# Altium footprint library texas.PCBLIB: 124 footprints (part 7 of 12)
Each footprint in its own frame and in the unit in brackets; x right, y up, seen from the top. Pads: shape width x height; smd on the part's side, far side on the other; paste and mask are expansions set on the pad; w line width, h text height; cw(c..) or ccw(c..) is an arc to the next point about the centre after c.
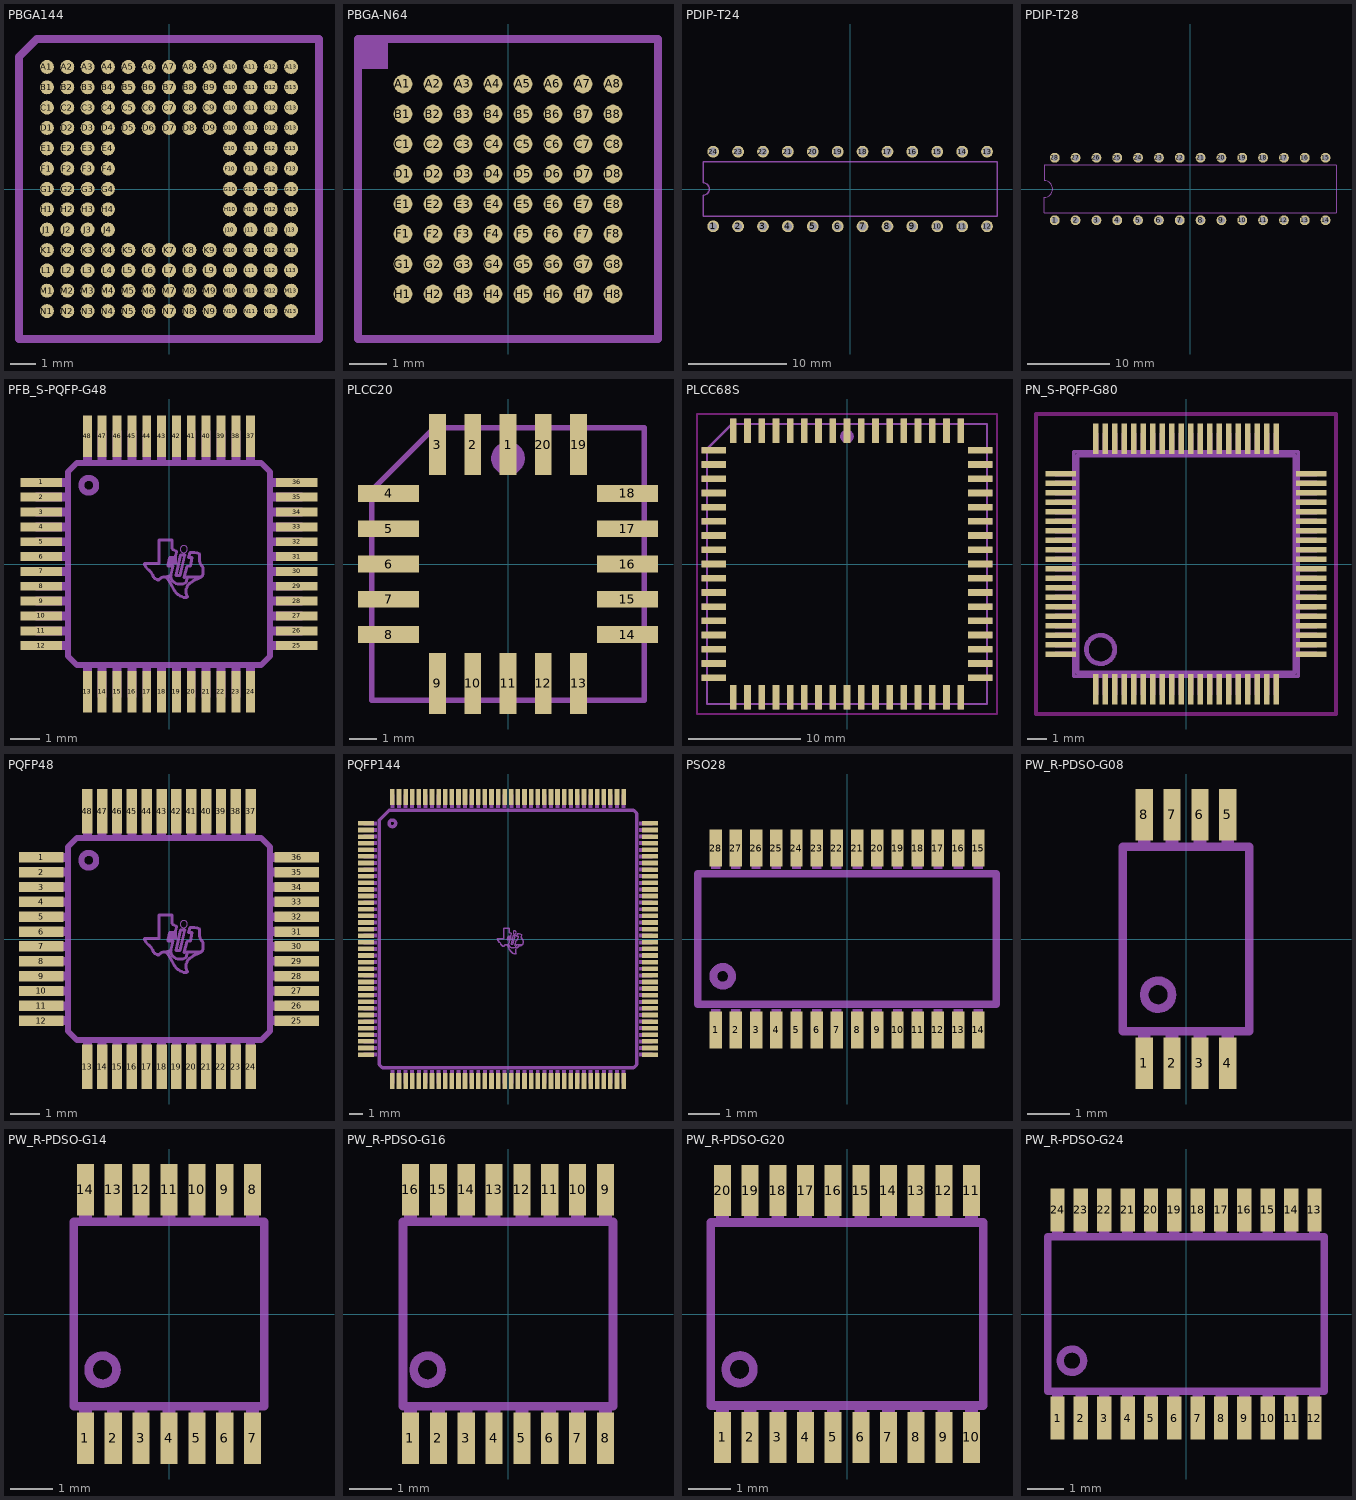
[diagram p6: the footprints below, top view; thin cyan lines are the x and y axes]

## PBGA144 [mm]
pads (144):
  rrect100% 0.55x0.55 smd: A1(-4.8,4.8) A2(-4,4.8) A3(-3.2,4.8) A4(-2.4,4.8) A5(-1.6,4.8) A6(-0.8,4.8) A7(0,4.8) A8(0.8,4.8) A9(1.6,4.8) A10(2.4,4.8) A11(3.2,4.8) A12(4,4.8) A13(4.8,4.8) B1(-4.8,4) B2(-4,4) B3(-3.2,4) B4(-2.4,4) B5(-1.6,4) B6(-0.8,4) B7(0,4) B8(0.8,4) B9(1.6,4) B10(2.4,4) B11(3.2,4) B12(4,4) B13(4.8,4) C1(-4.8,3.2) C2(-4,3.2) C3(-3.2,3.2) C4(-2.4,3.2) C5(-1.6,3.2) C6(-0.8,3.2) C7(0,3.2) C8(0.8,3.2) C9(1.6,3.2) C10(2.4,3.2) C11(3.2,3.2) C12(4,3.2) C13(4.8,3.2) D1(-4.8,2.4) D2(-4,2.4) D3(-3.2,2.4) D4(-2.4,2.4) D5(-1.6,2.4) D6(-0.8,2.4) D7(0,2.4) D8(0.8,2.4) D9(1.6,2.4) D10(2.4,2.4) D11(3.2,2.4) D12(4,2.4) D13(4.8,2.4) E1(-4.8,1.6) E2(-4,1.6) E3(-3.2,1.6) E4(-2.4,1.6) E10(2.4,1.6) E11(3.2,1.6) E12(4,1.6) E13(4.8,1.6) F1(-4.8,0.8) F2(-4,0.8) F3(-3.2,0.8) F4(-2.4,0.8) F10(2.4,0.8) F11(3.2,0.8) F12(4,0.8) F13(4.8,0.8) G1(-4.8,0) G2(-4,0) G3(-3.2,0) G4(-2.4,0) G10(2.4,0) G11(3.2,0) G12(4,0) G13(4.8,0) H1(-4.8,-0.8) H2(-4,-0.8) H3(-3.2,-0.8) H4(-2.4,-0.8) H10(2.4,-0.8) H11(3.2,-0.8) H12(4,-0.8) H13(4.8,-0.8) J1(-4.8,-1.6) J2(-4,-1.6) J3(-3.2,-1.6) J4(-2.4,-1.6) J10(2.4,-1.6) J11(3.2,-1.6) J12(4,-1.6) J13(4.8,-1.6) K1(-4.8,-2.4) K2(-4,-2.4) K3(-3.2,-2.4) K4(-2.4,-2.4) K5(-1.6,-2.4) K6(-0.8,-2.4) K7(0,-2.4) K8(0.8,-2.4) K9(1.6,-2.4) K10(2.4,-2.4) K11(3.2,-2.4) K12(4,-2.4) K13(4.8,-2.4) L1(-4.8,-3.2) L2(-4,-3.2) L3(-3.2,-3.2) L4(-2.4,-3.2) L5(-1.6,-3.2) L6(-0.8,-3.2) L7(0,-3.2) L8(0.8,-3.2) L9(1.6,-3.2) L10(2.4,-3.2) L11(3.2,-3.2) L12(4,-3.2) L13(4.8,-3.2) M1(-4.8,-4) M2(-4,-4) M3(-3.2,-4) M4(-2.4,-4) M5(-1.6,-4) M6(-0.8,-4) M7(0,-4) M8(0.8,-4) M9(1.6,-4) M10(2.4,-4) M11(3.2,-4) M12(4,-4) M13(4.8,-4) N1(-4.8,-4.8) N2(-4,-4.8) N3(-3.2,-4.8) N4(-2.4,-4.8) N5(-1.6,-4.8) N6(-0.8,-4.8) N7(0,-4.8) N8(0.8,-4.8) N9(1.6,-4.8) N10(2.4,-4.8) N11(3.2,-4.8) N12(4,-4.8) N13(4.8,-4.8)
Mechanical 2:
  lines w0.303: -5.9,-5.9 5.9,-5.9 5.9,5.9 -5.2,5.9 -5.9,5.2 -5.9,-5.9

## PBGA-N64 [mm]
pads (64):
  rrect100% 0.5x0.5 smd mask-0.25: A1(-2.8,2.8) A2(-2,2.8) A3(-1.2,2.8) A4(-0.4,2.8) A5(0.4,2.8) A6(1.2,2.8) A7(2,2.8) A8(2.8,2.8) B1(-2.8,2) B2(-2,2) B3(-1.2,2) B4(-0.4,2) B5(0.4,2) B6(1.2,2) B7(2,2) B8(2.8,2) C1(-2.8,1.2) C2(-2,1.2) C3(-1.2,1.2) C4(-0.4,1.2) C5(0.4,1.2) C6(1.2,1.2) C7(2,1.2) C8(2.8,1.2) D1(-2.8,0.4) D2(-2,0.4) D3(-1.2,0.4) D4(-0.4,0.4) D5(0.4,0.4) D6(1.2,0.4) D7(2,0.4) D8(2.8,0.4) E1(-2.8,-0.4) E2(-2,-0.4) E3(-1.2,-0.4) E4(-0.4,-0.4) E5(0.4,-0.4) E6(1.2,-0.4) E7(2,-0.4) E8(2.8,-0.4) F1(-2.8,-1.2) F2(-2,-1.2) F3(-1.2,-1.2) F4(-0.4,-1.2) F5(0.4,-1.2) F6(1.2,-1.2) F7(2,-1.2) F8(2.8,-1.2) G1(-2.8,-2) G2(-2,-2) G3(-1.2,-2) G4(-0.4,-2) G5(0.4,-2) G6(1.2,-2) G7(2,-2) G8(2.8,-2) H1(-2.8,-2.8) H2(-2,-2.8) H3(-1.2,-2.8) H4(-0.4,-2.8) H5(0.4,-2.8) H6(1.2,-2.8) H7(2,-2.8) H8(2.8,-2.8)
Top Solder:
  circle w0: c-2.8,2.8 r0.25
  circle w0: c-2.8,2 r0.25
  circle w0: c-2.8,1.2 r0.25
  circle w0: c-2.8,0.4 r0.25
  circle w0: c-2.8,-0.4 r0.25
  circle w0: c-2.8,-1.2 r0.25
  circle w0: c-2.8,-2 r0.25
  circle w0: c-2.8,-2.8 r0.25
  circle w0: c-2,2.8 r0.25
  circle w0: c-2,2 r0.25
  circle w0: c-2,1.2 r0.25
  circle w0: c-2,0.4 r0.25
  circle w0: c-2,-0.4 r0.25
  circle w0: c-2,-1.2 r0.25
  circle w0: c-2,-2 r0.25
  circle w0: c-2,-2.8 r0.25
  circle w0: c-1.2,2.8 r0.25
  circle w0: c-1.2,2 r0.25
  circle w0: c-1.2,1.2 r0.25
  circle w0: c-1.2,0.4 r0.25
  circle w0: c-1.2,-0.4 r0.25
  circle w0: c-1.2,-1.2 r0.25
  circle w0: c-1.2,-2 r0.25
  circle w0: c-1.2,-2.8 r0.25
  circle w0: c-0.4,2.8 r0.25
  circle w0: c-0.4,2 r0.25
  circle w0: c-0.4,1.2 r0.25
  circle w0: c-0.4,0.4 r0.25
  circle w0: c-0.4,-0.4 r0.25
  circle w0: c-0.4,-1.2 r0.25
  circle w0: c-0.4,-2 r0.25
  circle w0: c-0.4,-2.8 r0.25
  circle w0: c0.4,2.8 r0.25
  circle w0: c0.4,2 r0.25
  circle w0: c0.4,1.2 r0.25
  circle w0: c0.4,0.4 r0.25
  circle w0: c0.4,-0.4 r0.25
  circle w0: c0.4,-1.2 r0.25
  circle w0: c0.4,-2 r0.25
  circle w0: c0.4,-2.8 r0.25
  circle w0: c1.2,2.8 r0.25
  circle w0: c1.2,2 r0.25
  circle w0: c1.2,1.2 r0.25
  circle w0: c1.2,0.4 r0.25
  circle w0: c1.2,-0.4 r0.25
  circle w0: c1.2,-1.2 r0.25
  circle w0: c1.2,-2 r0.25
  circle w0: c1.2,-2.8 r0.25
  circle w0: c2,2.8 r0.25
  circle w0: c2,2 r0.25
  circle w0: c2,1.2 r0.25
  circle w0: c2,0.4 r0.25
  circle w0: c2,-0.4 r0.25
  circle w0: c2,-1.2 r0.25
  circle w0: c2,-2 r0.25
  circle w0: c2,-2.8 r0.25
  circle w0: c2.8,2.8 r0.25
  circle w0: c2.8,2 r0.25
  circle w0: c2.8,1.2 r0.25
  circle w0: c2.8,0.4 r0.25
  circle w0: c2.8,-0.4 r0.25
  circle w0: c2.8,-1.2 r0.25
  circle w0: c2.8,-2 r0.25
  circle w0: c2.8,-2.8 r0.25
Mechanical 2:
  rectangle: -4,3.2 -3.2,4
  lines w0.203: -4,-4 4,-4 4,4 -4,4 -4,-4

## PDIP-T24 [mil]
pads (24):
  round 47.24 hole 32: 1(-550,-150) 2(-450,-150) 3(-350,-150) 4(-250,-150) 5(-150,-150) 6(-50,-150) 7(50,-150) 8(150,-150) 9(250,-150) 10(350,-150) 11(450,-150) 12(550,-150) 13(550,150) 14(450,150) 15(350,150) 16(250,150) 17(150,150) 18(50,150) 19(-50,150) 20(-150,150) 21(-250,150) 22(-350,150) 23(-450,150) 24(-550,150)
Mechanical 2:
  lines w6: -590,-110 -590,-25 ccw(c-590,0) -590,25 -590,110 590,110 590,-110 -590,-110

## PDIP-T28 [mil]
pads (28):
  round 47.24 hole 32: 1(-650,-150) 2(-550,-150) 3(-450,-150) 4(-350,-150) 5(-250,-150) 6(-150,-150) 7(-50,-150) 8(50,-150) 9(150,-150) 10(250,-150) 11(350,-150) 12(450,-150) 13(550,-150) 14(650,-150) 15(650,150) 16(550,150) 17(450,150) 18(350,150) 19(250,150) 20(150,150) 21(50,150) 22(-50,150) 23(-150,150) 24(-250,150) 25(-350,150) 26(-450,150) 27(-550,150) 28(-650,150)
Mechanical 2:
  lines w6: -700,-115 700,-115 700,115 -700,115 -700,40 cw(c-700,0) -700,-40 -700,-115

## PFB_S-PQFP-G48 [mm]
pads (48):
  rect 1.4x0.3 smd mask-0.7: 1(-4.3,2.75) 2(-4.3,2.25) 3(-4.3,1.75) 4(-4.3,1.25) 5(-4.3,0.75) 6(-4.3,0.25) 7(-4.3,-0.25) 8(-4.3,-0.75) 9(-4.3,-1.25) 10(-4.3,-1.75) 11(-4.3,-2.25) 12(-4.3,-2.75) 25(4.3,-2.75) 26(4.3,-2.25) 27(4.3,-1.75) 28(4.3,-1.25) 29(4.3,-0.75) 30(4.3,-0.25) 31(4.3,0.25) 32(4.3,0.75) 33(4.3,1.25) 34(4.3,1.75) 35(4.3,2.25) 36(4.3,2.75)
  rect 0.3x1.4 smd mask-0.7: 13(-2.75,-4.3) 14(-2.25,-4.3) 15(-1.75,-4.3) 16(-1.25,-4.3) 17(-0.75,-4.3) 18(-0.25,-4.3) 19(0.25,-4.3) 20(0.75,-4.3) 21(1.25,-4.3) 22(1.75,-4.3) 23(2.25,-4.3) 24(2.75,-4.3) 37(2.75,4.3) 38(2.25,4.3) 39(1.75,4.3) 40(1.25,4.3) 41(0.75,4.3) 42(0.25,4.3) 43(-0.25,4.3) 44(-0.75,4.3) 45(-1.25,4.3) 46(-1.75,4.3) 47(-2.25,4.3) 48(-2.75,4.3)
Top Solder:
  rectangle: -5.05,2.575 -3.55,2.925
  rectangle: -5.05,2.075 -3.55,2.425
  rectangle: -5.05,1.575 -3.55,1.925
  rectangle: -5.05,1.075 -3.55,1.425
  rectangle: -5.05,0.575 -3.55,0.925
  rectangle: -5.05,0.075 -3.55,0.425
  rectangle: -5.05,-0.425 -3.55,-0.075
  rectangle: -5.05,-0.925 -3.55,-0.575
  rectangle: -5.05,-1.425 -3.55,-1.075
  rectangle: -5.05,-1.925 -3.55,-1.575
  rectangle: -5.05,-2.425 -3.55,-2.075
  rectangle: -5.05,-2.925 -3.55,-2.575
  region: -2.575,-5.05 -2.575,-3.55 -2.925,-3.55 -2.925,-5.05
  region: -2.075,-5.05 -2.075,-3.55 -2.425,-3.55 -2.425,-5.05
  region: -1.575,-5.05 -1.575,-3.55 -1.925,-3.55 -1.925,-5.05
  region: -1.075,-5.05 -1.075,-3.55 -1.425,-3.55 -1.425,-5.05
  region: -0.575,-5.05 -0.575,-3.55 -0.925,-3.55 -0.925,-5.05
  region: -0.075,-5.05 -0.075,-3.55 -0.425,-3.55 -0.425,-5.05
  region: 0.425,-5.05 0.425,-3.55 0.075,-3.55 0.075,-5.05
  region: 0.925,-5.05 0.925,-3.55 0.575,-3.55 0.575,-5.05
  region: 1.425,-5.05 1.425,-3.55 1.075,-3.55 1.075,-5.05
  region: 1.925,-5.05 1.925,-3.55 1.575,-3.55 1.575,-5.05
  region: 2.425,-5.05 2.425,-3.55 2.075,-3.55 2.075,-5.05
  region: 2.925,-5.05 2.925,-3.55 2.575,-3.55 2.575,-5.05
  region: 5.05,-2.575 3.55,-2.575 3.55,-2.925 5.05,-2.925
  region: 5.05,-2.075 3.55,-2.075 3.55,-2.425 5.05,-2.425
  region: 5.05,-1.575 3.55,-1.575 3.55,-1.925 5.05,-1.925
  region: 5.05,-1.075 3.55,-1.075 3.55,-1.425 5.05,-1.425
  region: 5.05,-0.575 3.55,-0.575 3.55,-0.925 5.05,-0.925
  region: 5.05,-0.075 3.55,-0.075 3.55,-0.425 5.05,-0.425
  region: 5.05,0.425 3.55,0.425 3.55,0.075 5.05,0.075
  region: 5.05,0.925 3.55,0.925 3.55,0.575 5.05,0.575
  region: 5.05,1.425 3.55,1.425 3.55,1.075 5.05,1.075
  region: 5.05,1.925 3.55,1.925 3.55,1.575 5.05,1.575
  region: 5.05,2.425 3.55,2.425 3.55,2.075 5.05,2.075
  region: 5.05,2.925 3.55,2.925 3.55,2.575 5.05,2.575
  region: 2.575,5.05 2.575,3.55 2.925,3.55 2.925,5.05
  region: 2.075,5.05 2.075,3.55 2.425,3.55 2.425,5.05
  region: 1.575,5.05 1.575,3.55 1.925,3.55 1.925,5.05
  region: 1.075,5.05 1.075,3.55 1.425,3.55 1.425,5.05
  region: 0.575,5.05 0.575,3.55 0.925,3.55 0.925,5.05
  region: 0.075,5.05 0.075,3.55 0.425,3.55 0.425,5.05
  region: -0.425,5.05 -0.425,3.55 -0.075,3.55 -0.075,5.05
  region: -0.925,5.05 -0.925,3.55 -0.575,3.55 -0.575,5.05
  region: -1.425,5.05 -1.425,3.55 -1.075,3.55 -1.075,5.05
  region: -1.925,5.05 -1.925,3.55 -1.575,3.55 -1.575,5.05
  region: -2.425,5.05 -2.425,3.55 -2.075,3.55 -2.075,5.05
  region: -2.925,5.05 -2.925,3.55 -2.575,3.55 -2.575,5.05
Mechanical 2:
  circle w0.203: c-2.7,2.65 r0.25
  lines w0.203: -3.4,-3.1 -3.4,3.1 -3.1,3.4 3.1,3.4 3.4,3.1 3.4,-3.1 3.1,-3.4 -3.1,-3.4 -3.4,-3.1
Mechanical 18:
  drawing of 146 lines, arcs and shapes, not listed

## PLCC20 [mm]
pads (20):
  rect 0.6x2.2 smd: 1(0,4.3) 2(-1.27,4.3) 3(-2.54,4.3) 9(-2.54,-4.3) 10(-1.27,-4.3) 11(0,-4.3) 12(1.27,-4.3) 13(2.54,-4.3) 19(2.54,4.3) 20(1.27,4.3)
  rect 2.2x0.6 smd: 4(-4.3,2.54) 5(-4.3,1.27) 6(-4.3,0) 7(-4.3,-1.27) 8(-4.3,-2.54) 14(4.3,-2.54) 15(4.3,-1.27) 16(4.3,0) 17(4.3,1.27) 18(4.3,2.54)
Mechanical 18:
  circle w0.61: c0,3.8 r0.3
  rectangle: -0.26,4.95 0.26,5.4
  rectangle: -1.53,4.95 -1.01,5.4
  rectangle: -2.8,4.95 -2.28,5.4
  rectangle: -5.4,2.28 -4.95,2.8
  rectangle: -5.4,1.01 -4.95,1.53
  rectangle: -5.4,-0.26 -4.95,0.26
  rectangle: -5.4,-1.53 -4.95,-1.01
  rectangle: -5.4,-2.8 -4.95,-2.28
  rectangle: -2.8,-5.4 -2.28,-4.95
  rectangle: -1.53,-5.4 -1.01,-4.95
  rectangle: -0.26,-5.4 0.26,-4.95
  rectangle: 1.01,-5.4 1.53,-4.95
  rectangle: 2.28,-5.4 2.8,-4.95
  rectangle: 4.95,-2.8 5.4,-2.28
  rectangle: 4.95,-1.53 5.4,-1.01
  rectangle: 4.95,-0.26 5.4,0.26
  rectangle: 4.95,1.01 5.4,1.53
  rectangle: 4.95,2.28 5.4,2.8
  rectangle: 2.28,4.95 2.8,5.4
  rectangle: 1.01,4.95 1.53,5.4
  lines w0.203: -4.9,-4.9 -4.9,2.665 -2.665,4.9 4.9,4.9 4.9,-4.9 -4.9,-4.9

## PLCC68S [mil]
pads (68):
  rect 23.62x86.61 smd: 1(0,468.5) 2(-50,468.5) 3(-100,468.5) 4(-150,468.5) 5(-200,468.5) 6(-250,468.5) 7(-300,468.5) 8(-350,468.5) 9(-400,468.5) 27(-400,-468.5) 28(-350,-468.5) 29(-300,-468.5) 30(-250,-468.5) 31(-200,-468.5) 32(-150,-468.5) 33(-100,-468.5) 34(-50,-468.5) 35(0,-468.5) 36(50,-468.5) 37(100,-468.5) 38(150,-468.5) 39(200,-468.5) 40(250,-468.5) 41(300,-468.5) 42(350,-468.5) 43(400,-468.5) 61(400,468.5) 62(350,468.5) 63(300,468.5) 64(250,468.5) 65(200,468.5) 66(150,468.5) 67(100,468.5) 68(50,468.5)
  rect 86.61x23.62 smd: 10(-468.5,400) 11(-468.5,350) 12(-468.5,300) 13(-468.5,250) 14(-468.5,200) 15(-468.5,150) 16(-468.5,100) 17(-468.5,50) 18(-468.5,0) 19(-468.5,-50) 20(-468.5,-100) 21(-468.5,-150) 22(-468.5,-200) 23(-468.5,-250) 24(-468.5,-300) 25(-468.5,-350) 26(-468.5,-400) 44(468.5,-400) 45(468.5,-350) 46(468.5,-300) 47(468.5,-250) 48(468.5,-200) 49(468.5,-150) 50(468.5,-100) 51(468.5,-50) 52(468.5,0) 53(468.5,50) 54(468.5,100) 55(468.5,150) 56(468.5,200) 57(468.5,250) 58(468.5,300) 59(468.5,350) 60(468.5,400)
Keep-Out Layer:
  lines w7.87: -527.68,-527.68 527.68,-527.68 527.68,527.68 -527.68,527.68 -527.68,-527.68
Mechanical 18:
  circle w24: c0,448.82 r11.81
  rectangle: -10.24,494.09 10.24,511.81
  rectangle: -60.24,494.09 -39.76,511.81
  rectangle: -110.24,494.09 -89.76,511.81
  rectangle: -160.24,494.09 -139.76,511.81
  rectangle: -210.24,494.09 -189.76,511.81
  rectangle: -260.24,494.09 -239.76,511.81
  rectangle: -310.24,494.09 -289.76,511.81
  rectangle: -360.24,494.09 -339.76,511.81
  rectangle: -410.24,494.09 -389.76,511.81
  rectangle: -511.81,389.76 -494.09,410.24
  rectangle: -511.81,339.76 -494.09,360.24
  rectangle: -511.81,289.76 -494.09,310.24
  rectangle: -511.81,239.76 -494.09,260.24
  rectangle: -511.81,189.76 -494.09,210.24
  rectangle: -511.81,139.76 -494.09,160.24
  rectangle: -511.81,89.76 -494.09,110.24
  rectangle: -511.81,39.76 -494.09,60.24
  rectangle: -511.81,-10.24 -494.09,10.24
  rectangle: -511.81,-60.24 -494.09,-39.76
  rectangle: -511.81,-110.24 -494.09,-89.76
  rectangle: -511.81,-160.24 -494.09,-139.76
  rectangle: -511.81,-210.24 -494.09,-189.76
  rectangle: -511.81,-260.24 -494.09,-239.76
  rectangle: -511.81,-310.24 -494.09,-289.76
  rectangle: -511.81,-360.24 -494.09,-339.76
  rectangle: -511.81,-410.24 -494.09,-389.76
  rectangle: -410.24,-511.81 -389.76,-494.09
  rectangle: -360.24,-511.81 -339.76,-494.09
  rectangle: -310.24,-511.81 -289.76,-494.09
  rectangle: -260.24,-511.81 -239.76,-494.09
  rectangle: -210.24,-511.81 -189.76,-494.09
  rectangle: -160.24,-511.81 -139.76,-494.09
  rectangle: -110.24,-511.81 -89.76,-494.09
  rectangle: -60.24,-511.81 -39.76,-494.09
  rectangle: -10.24,-511.81 10.24,-494.09
  rectangle: 39.76,-511.81 60.24,-494.09
  rectangle: 89.76,-511.81 110.24,-494.09
  rectangle: 139.76,-511.81 160.24,-494.09
  rectangle: 189.76,-511.81 210.24,-494.09
  rectangle: 239.76,-511.81 260.24,-494.09
  rectangle: 289.76,-511.81 310.24,-494.09
  rectangle: 339.76,-511.81 360.24,-494.09
  rectangle: 389.76,-511.81 410.24,-494.09
  rectangle: 494.09,-410.24 511.81,-389.76
  rectangle: 494.09,-360.24 511.81,-339.76
  rectangle: 494.09,-310.24 511.81,-289.76
  rectangle: 494.09,-260.24 511.81,-239.76
  rectangle: 494.09,-210.24 511.81,-189.76
  rectangle: 494.09,-160.24 511.81,-139.76
  rectangle: 494.09,-110.24 511.81,-89.76
  rectangle: 494.09,-60.24 511.81,-39.76
  rectangle: 494.09,-10.24 511.81,10.24
  rectangle: 494.09,39.76 511.81,60.24
  rectangle: 494.09,89.76 511.81,110.24
  rectangle: 494.09,139.76 511.81,160.24
  rectangle: 494.09,189.76 511.81,210.24
  rectangle: 494.09,239.76 511.81,260.24
  rectangle: 494.09,289.76 511.81,310.24
  rectangle: 494.09,339.76 511.81,360.24
  rectangle: 494.09,389.76 511.81,410.24
  rectangle: 389.76,494.09 410.24,511.81
  rectangle: 339.76,494.09 360.24,511.81
  rectangle: 289.76,494.09 310.24,511.81
  rectangle: 239.76,494.09 260.24,511.81
  rectangle: 189.76,494.09 210.24,511.81
  rectangle: 139.76,494.09 160.24,511.81
  rectangle: 89.76,494.09 110.24,511.81
  rectangle: 39.76,494.09 60.24,511.81
  lines w8: -492.13,-492.13 -492.13,404.13 -404.13,492.13 492.13,492.13 492.13,-492.13 -492.13,-492.13

## PN_S-PQFP-G80 [mm]
pads (80):
  rect 0.3x1.6 smd: 1(-4.75,-6.6) 2(-4.25,-6.6) 3(-3.75,-6.6) 4(-3.25,-6.6) 5(-2.75,-6.6) 6(-2.25,-6.6) 7(-1.75,-6.6) 8(-1.25,-6.6) 9(-0.75,-6.6) 10(-0.25,-6.6) 11(0.25,-6.6) 12(0.75,-6.6) 13(1.25,-6.6) 14(1.75,-6.6) 15(2.25,-6.6) 16(2.75,-6.6) 17(3.25,-6.6) 18(3.75,-6.6) 19(4.25,-6.6) 20(4.75,-6.6) 41(4.75,6.6) 42(4.25,6.6) 43(3.75,6.6) 44(3.25,6.6) 45(2.75,6.6) 46(2.25,6.6) 47(1.75,6.6) 48(1.25,6.6) 49(0.75,6.6) 50(0.25,6.6) 51(-0.25,6.6) 52(-0.75,6.6) 53(-1.25,6.6) 54(-1.75,6.6) 55(-2.25,6.6) 56(-2.75,6.6) 57(-3.25,6.6) 58(-3.75,6.6) 59(-4.25,6.6) 60(-4.75,6.6)
  rect 1.6x0.3 smd: 21(6.6,-4.75) 22(6.6,-4.25) 23(6.6,-3.75) 24(6.6,-3.25) 25(6.6,-2.75) 26(6.6,-2.25) 27(6.6,-1.75) 28(6.6,-1.25) 29(6.6,-0.75) 30(6.6,-0.25) 31(6.6,0.25) 32(6.6,0.75) 33(6.6,1.25) 34(6.6,1.75) 35(6.6,2.25) 36(6.6,2.75) 37(6.6,3.25) 38(6.6,3.75) 39(6.6,4.25) 40(6.6,4.75) 61(-6.6,4.75) 62(-6.6,4.25) 63(-6.6,3.75) 64(-6.6,3.25) 65(-6.6,2.75) 66(-6.6,2.25) 67(-6.6,1.75) 68(-6.6,1.25) 69(-6.6,0.75) 70(-6.6,0.25) 71(-6.6,-0.25) 72(-6.6,-0.75) 73(-6.6,-1.25) 74(-6.6,-1.75) 75(-6.6,-2.25) 76(-6.6,-2.75) 77(-6.6,-3.25) 78(-6.6,-3.75) 79(-6.6,-4.25) 80(-6.6,-4.75)
Keep-Out Layer:
  lines w0.2: -7.9,-7.9 -7.9,7.9 7.9,7.9 7.9,-7.9 -7.9,-7.9
Mechanical 2:
  circle w0.254: c-4.5,-4.5 r0.75
  lines w0.203: -5.72,-5.71 5.71,-5.71 5.71,5.71 -5.72,5.71 -5.72,-5.71
Mechanical 18:
  rectangle: -4.9,-6.9 -4.6,-5.95
  rectangle: -4.4,-6.9 -4.1,-5.95
  rectangle: -3.9,-6.9 -3.6,-5.95
  rectangle: -3.4,-6.9 -3.1,-5.95
  rectangle: -2.9,-6.9 -2.6,-5.95
  rectangle: -2.4,-6.9 -2.1,-5.95
  rectangle: -1.9,-6.9 -1.6,-5.95
  rectangle: -1.4,-6.9 -1.1,-5.95
  rectangle: -0.9,-6.9 -0.6,-5.95
  rectangle: -0.4,-6.9 -0.1,-5.95
  rectangle: 0.1,-6.9 0.4,-5.95
  rectangle: 0.6,-6.9 0.9,-5.95
  rectangle: 1.1,-6.9 1.4,-5.95
  rectangle: 1.6,-6.9 1.9,-5.95
  rectangle: 2.1,-6.9 2.4,-5.95
  rectangle: 2.6,-6.9 2.9,-5.95
  rectangle: 3.1,-6.9 3.4,-5.95
  rectangle: 3.6,-6.9 3.9,-5.95
  rectangle: 4.1,-6.9 4.4,-5.95
  rectangle: 4.6,-6.9 4.9,-5.95
  rectangle: 5.95,-4.9 6.9,-4.6
  rectangle: 5.95,-4.4 6.9,-4.1
  rectangle: 5.95,-3.9 6.9,-3.6
  rectangle: 5.95,-3.4 6.9,-3.1
  rectangle: 5.95,-2.9 6.9,-2.6
  rectangle: 5.95,-2.4 6.9,-2.1
  rectangle: 5.95,-1.9 6.9,-1.6
  rectangle: 5.95,-1.4 6.9,-1.1
  rectangle: 5.95,-0.9 6.9,-0.6
  rectangle: 5.95,-0.4 6.9,-0.1
  rectangle: 5.95,0.1 6.9,0.4
  rectangle: 5.95,0.6 6.9,0.9
  rectangle: 5.95,1.1 6.9,1.4
  rectangle: 5.95,1.6 6.9,1.9
  rectangle: 5.95,2.1 6.9,2.4
  rectangle: 5.95,2.6 6.9,2.9
  rectangle: 5.95,3.1 6.9,3.4
  rectangle: 5.95,3.6 6.9,3.9
  rectangle: 5.95,4.1 6.9,4.4
  rectangle: 5.95,4.6 6.9,4.9
  rectangle: 4.6,5.95 4.9,6.9
  rectangle: 4.1,5.95 4.4,6.9
  rectangle: 3.6,5.95 3.9,6.9
  rectangle: 3.1,5.95 3.4,6.9
  rectangle: 2.6,5.95 2.9,6.9
  rectangle: 2.1,5.95 2.4,6.9
  rectangle: 1.6,5.95 1.9,6.9
  rectangle: 1.1,5.95 1.4,6.9
  rectangle: 0.6,5.95 0.9,6.9
  rectangle: 0.1,5.95 0.4,6.9
  rectangle: -0.4,5.95 -0.1,6.9
  rectangle: -0.9,5.95 -0.6,6.9
  rectangle: -1.4,5.95 -1.1,6.9
  rectangle: -1.9,5.95 -1.6,6.9
  rectangle: -2.4,5.95 -2.1,6.9
  rectangle: -2.9,5.95 -2.6,6.9
  rectangle: -3.4,5.95 -3.1,6.9
  rectangle: -3.9,5.95 -3.6,6.9
  rectangle: -4.4,5.95 -4.1,6.9
  rectangle: -4.9,5.95 -4.6,6.9
  rectangle: -6.9,4.6 -5.95,4.9
  rectangle: -6.9,4.1 -5.95,4.4
  rectangle: -6.9,3.6 -5.95,3.9
  rectangle: -6.9,3.1 -5.95,3.4
  rectangle: -6.9,2.6 -5.95,2.9
  rectangle: -6.9,2.1 -5.95,2.4
  rectangle: -6.9,1.6 -5.95,1.9
  rectangle: -6.9,1.1 -5.95,1.4
  rectangle: -6.9,0.6 -5.95,0.9
  rectangle: -6.9,0.1 -5.95,0.4
  rectangle: -6.9,-0.4 -5.95,-0.1
  rectangle: -6.9,-0.9 -5.95,-0.6
  rectangle: -6.9,-1.4 -5.95,-1.1
  rectangle: -6.9,-1.9 -5.95,-1.6
  rectangle: -6.9,-2.4 -5.95,-2.1
  rectangle: -6.9,-2.9 -5.95,-2.6
  rectangle: -6.9,-3.4 -5.95,-3.1
  rectangle: -6.9,-3.9 -5.95,-3.6
  rectangle: -6.9,-4.4 -5.95,-4.1
  rectangle: -6.9,-4.9 -5.95,-4.6
  lines w0.203: -5.91,-5.91 5.91,-5.91 5.91,5.91 -5.91,5.91 -5.91,-5.91

## PQFP48 [mm]
pads (48):
  rect 1.5x0.35 smd: 1(-4.3,2.75) 2(-4.3,2.25) 3(-4.3,1.75) 4(-4.3,1.25) 5(-4.3,0.75) 6(-4.3,0.25) 7(-4.3,-0.25) 8(-4.3,-0.75) 9(-4.3,-1.25) 10(-4.3,-1.75) 11(-4.3,-2.25) 12(-4.3,-2.75) 25(4.3,-2.75) 26(4.3,-2.25) 27(4.3,-1.75) 28(4.3,-1.25) 29(4.3,-0.75) 30(4.3,-0.25) 31(4.3,0.25) 32(4.3,0.75) 33(4.3,1.25) 34(4.3,1.75) 35(4.3,2.25) 36(4.3,2.75)
  rect 0.35x1.5 smd: 13(-2.75,-4.3) 14(-2.25,-4.3) 15(-1.75,-4.3) 16(-1.25,-4.3) 17(-0.75,-4.3) 18(-0.25,-4.3) 19(0.25,-4.3) 20(0.75,-4.3) 21(1.25,-4.3) 22(1.75,-4.3) 23(2.25,-4.3) 24(2.75,-4.3) 37(2.75,4.3) 38(2.25,4.3) 39(1.75,4.3) 40(1.25,4.3) 41(0.75,4.3) 42(0.25,4.3) 43(-0.25,4.3) 44(-0.75,4.3) 45(-1.25,4.3) 46(-1.75,4.3) 47(-2.25,4.3) 48(-2.75,4.3)
Mechanical 2:
  circle w0.203: c-2.7,2.65 r0.25
  lines w0.203: -3.4,-3.1 -3.4,3.1 -3.1,3.4 3.1,3.4 3.4,3.1 3.4,-3.1 3.1,-3.4 -3.1,-3.4 -3.4,-3.1
Mechanical 18:
  drawing of 146 lines, arcs and shapes, not listed

## PQFP144 [mm]
pads (144):
  rect 1.2x0.35 smd: 1(-10.75,8.75) 2(-10.75,8.25) 3(-10.75,7.75) 4(-10.75,7.25) 5(-10.75,6.75) 6(-10.75,6.25) 7(-10.75,5.75) 8(-10.75,5.25) 9(-10.75,4.75) 10(-10.75,4.25) 11(-10.75,3.75) 12(-10.75,3.25) 13(-10.75,2.75) 14(-10.75,2.25) 15(-10.75,1.75) 16(-10.75,1.25) 17(-10.75,0.75) 18(-10.75,0.25) 19(-10.75,-0.25) 20(-10.75,-0.75) 21(-10.75,-1.25) 22(-10.75,-1.75) 23(-10.75,-2.25) 24(-10.75,-2.75) 25(-10.75,-3.25) 26(-10.75,-3.75) 27(-10.75,-4.25) 28(-10.75,-4.75) 29(-10.75,-5.25) 30(-10.75,-5.75) 31(-10.75,-6.25) 32(-10.75,-6.75) 33(-10.75,-7.25) 34(-10.75,-7.75) 35(-10.75,-8.25) 36(-10.75,-8.75) 73(10.75,-8.75) 74(10.75,-8.25) 75(10.75,-7.75) 76(10.75,-7.25) 77(10.75,-6.75) 78(10.75,-6.25) 79(10.75,-5.75) 80(10.75,-5.25) 81(10.75,-4.75) 82(10.75,-4.25) 83(10.75,-3.75) 84(10.75,-3.25) 85(10.75,-2.75) 86(10.75,-2.25) 87(10.75,-1.75) 88(10.75,-1.25) 89(10.75,-0.75) 90(10.75,-0.25) 91(10.75,0.25) 92(10.75,0.75) 93(10.75,1.25) 94(10.75,1.75) 95(10.75,2.25) 96(10.75,2.75) 97(10.75,3.25) 98(10.75,3.75) 99(10.75,4.25) 100(10.75,4.75) 101(10.75,5.25) 102(10.75,5.75) 103(10.75,6.25) 104(10.75,6.75) 105(10.75,7.25) 106(10.75,7.75) 107(10.75,8.25) 108(10.75,8.75)
  rect 0.35x1.2 smd: 37(-8.75,-10.75) 38(-8.25,-10.75) 39(-7.75,-10.75) 40(-7.25,-10.75) 41(-6.75,-10.75) 42(-6.25,-10.75) 43(-5.75,-10.75) 44(-5.25,-10.75) 45(-4.75,-10.75) 46(-4.25,-10.75) 47(-3.75,-10.75) 48(-3.25,-10.75) 49(-2.75,-10.75) 50(-2.25,-10.75) 51(-1.75,-10.75) 52(-1.25,-10.75) 53(-0.75,-10.75) 54(-0.25,-10.75) 55(0.25,-10.75) 56(0.75,-10.75) 57(1.25,-10.75) 58(1.75,-10.75) 59(2.25,-10.75) 60(2.75,-10.75) 61(3.25,-10.75) 62(3.75,-10.75) 63(4.25,-10.75) 64(4.75,-10.75) 65(5.25,-10.75) 66(5.75,-10.75) 67(6.25,-10.75) 68(6.75,-10.75) 69(7.25,-10.75) 70(7.75,-10.75) 71(8.25,-10.75) 72(8.75,-10.75) 109(8.75,10.75) 110(8.25,10.75) 111(7.75,10.75) 112(7.25,10.75) 113(6.75,10.75) 114(6.25,10.75) 115(5.75,10.75) 116(5.25,10.75) 117(4.75,10.75) 118(4.25,10.75) 119(3.75,10.75) 120(3.25,10.75) 121(2.75,10.75) 122(2.25,10.75) 123(1.75,10.75) 124(1.25,10.75) 125(0.75,10.75) 126(0.25,10.75) 127(-0.25,10.75) 128(-0.75,10.75) 129(-1.25,10.75) 130(-1.75,10.75) 131(-2.25,10.75) 132(-2.75,10.75) 133(-3.25,10.75) 134(-3.75,10.75) 135(-4.25,10.75) 136(-4.75,10.75) 137(-5.25,10.75) 138(-5.75,10.75) 139(-6.25,10.75) 140(-6.75,10.75) 141(-7.25,10.75) 142(-7.75,10.75) 143(-8.25,10.75) 144(-8.75,10.75)
Mechanical 2:
  circle w0.254: c-8.75,8.75 r0.25
  lines w0.254: -9.75,-9.5 -9.5,-9.75 9.5,-9.75 9.75,-9.5 9.75,9.5 9.5,9.75 -9,9.75 -9.75,9 -9.75,-9.5
Mechanical 18:
  drawing of 242 lines, arcs and shapes, not listed

## PSO28 [mm]
pads (28):
  rect 0.4x1.2 smd: 1(-4.225,-2.925) 2(-3.575,-2.925) 3(-2.925,-2.925) 4(-2.275,-2.925) 5(-1.625,-2.925) 6(-0.975,-2.925) 7(-0.325,-2.925) 8(0.325,-2.925) 9(0.975,-2.925) 10(1.625,-2.925) 11(2.275,-2.925) 12(2.925,-2.925) 13(3.575,-2.925) 14(4.225,-2.925) 15(4.225,2.925) 16(3.575,2.925) 17(2.925,2.925) 18(2.275,2.925) 19(1.625,2.925) 20(0.975,2.925) 21(0.325,2.925) 22(-0.325,2.925) 23(-0.975,2.925) 24(-1.625,2.925) 25(-2.275,2.925) 26(-2.925,2.925) 27(-3.575,2.925) 28(-4.225,2.925)
Mechanical 2:
  circle w0.254: c-4,-1.2 r0.3
  lines w0.254: -4.8,-2.1 4.8,-2.1 4.8,2.1 -4.8,2.1 -4.8,-2.1
Mechanical 18:
  rectangle: -4.375,-3.3 -4.075,-2.25
  rectangle: -3.725,-3.3 -3.425,-2.25
  rectangle: -3.075,-3.3 -2.775,-2.25
  rectangle: -2.425,-3.3 -2.125,-2.25
  rectangle: -1.775,-3.3 -1.475,-2.25
  rectangle: -1.125,-3.3 -0.825,-2.25
  rectangle: -0.475,-3.3 -0.175,-2.25
  rectangle: 0.175,-3.3 0.475,-2.25
  rectangle: 0.825,-3.3 1.125,-2.25
  rectangle: 1.475,-3.3 1.775,-2.25
  rectangle: 2.125,-3.3 2.425,-2.25
  rectangle: 2.775,-3.3 3.075,-2.25
  rectangle: 3.425,-3.3 3.725,-2.25
  rectangle: 4.075,-3.3 4.375,-2.25
  rectangle: 4.075,2.25 4.375,3.3
  rectangle: 3.425,2.25 3.725,3.3
  rectangle: 2.775,2.25 3.075,3.3
  rectangle: 2.125,2.25 2.425,3.3
  rectangle: 1.475,2.25 1.775,3.3
  rectangle: 0.825,2.25 1.125,3.3
  rectangle: 0.175,2.25 0.475,3.3
  rectangle: -0.475,2.25 -0.175,3.3
  rectangle: -1.125,2.25 -0.825,3.3
  rectangle: -1.775,2.25 -1.475,3.3
  rectangle: -2.425,2.25 -2.125,3.3
  rectangle: -3.075,2.25 -2.775,3.3
  rectangle: -3.725,2.25 -3.425,3.3
  rectangle: -4.375,2.25 -4.075,3.3

## PW_R-PDSO-G08 [mm]
pads (8):
  rect 0.4x1.2 smd: 1(-0.975,-2.9) 2(-0.325,-2.9) 3(0.325,-2.9) 4(0.975,-2.9) 5(0.975,2.9) 6(0.325,2.9) 7(-0.325,2.9) 8(-0.975,2.9)
Mechanical 2:
  circle w0.203: c-0.65,-1.3 r0.325
  lines w0.203: -1.475,-2.15 1.475,-2.15 1.475,2.15 -1.475,2.15 -1.475,-2.15
Mechanical 18:
  rectangle: -1.125,-3.3 -0.825,-2.23
  rectangle: -0.475,-3.3 -0.175,-2.23
  rectangle: 0.175,-3.3 0.475,-2.23
  rectangle: 0.825,-3.3 1.125,-2.23
  region: 1.125,3.3 0.825,3.3 0.825,2.23 1.125,2.23
  region: 0.475,3.3 0.175,3.3 0.175,2.23 0.475,2.23
  region: -0.175,3.3 -0.475,3.3 -0.475,2.23 -0.175,2.23
  region: -0.825,3.3 -1.125,3.3 -1.125,2.23 -0.825,2.23

## PW_R-PDSO-G14 [mm]
pads (14):
  rect 0.4x1.2 smd: 1(-1.95,-2.9) 2(-1.3,-2.9) 3(-0.65,-2.9) 4(0,-2.9) 5(0.65,-2.9) 6(1.3,-2.9) 7(1.95,-2.9) 8(1.95,2.9) 9(1.3,2.9) 10(0.65,2.9) 11(0,2.9) 12(-0.65,2.9) 13(-1.3,2.9) 14(-1.95,2.9)
Mechanical 2:
  circle w0.203: c-1.55,-1.3 r0.325
  lines w0.203: -2.225,-2.15 2.225,-2.15 2.225,2.15 -2.225,2.15 -2.225,-2.15
Mechanical 18:
  rectangle: -2.1,-3.3 -1.8,-2.23
  rectangle: -1.45,-3.3 -1.15,-2.23
  rectangle: -0.8,-3.3 -0.5,-2.23
  rectangle: -0.15,-3.3 0.15,-2.23
  rectangle: 0.5,-3.3 0.8,-2.23
  rectangle: 1.15,-3.3 1.45,-2.23
  rectangle: 1.8,-3.3 2.1,-2.23
  region: 2.1,3.3 1.8,3.3 1.8,2.23 2.1,2.23
  region: 1.45,3.3 1.15,3.3 1.15,2.23 1.45,2.23
  region: 0.8,3.3 0.5,3.3 0.5,2.23 0.8,2.23
  region: 0.15,3.3 -0.15,3.3 -0.15,2.23 0.15,2.23
  region: -0.5,3.3 -0.8,3.3 -0.8,2.23 -0.5,2.23
  region: -1.15,3.3 -1.45,3.3 -1.45,2.23 -1.15,2.23
  region: -1.8,3.3 -2.1,3.3 -2.1,2.23 -1.8,2.23

## PW_R-PDSO-G16 [mm]
pads (16):
  rect 0.4x1.2 smd: 1(-2.275,-2.9) 2(-1.625,-2.9) 3(-0.975,-2.9) 4(-0.325,-2.9) 5(0.325,-2.9) 6(0.975,-2.9) 7(1.625,-2.9) 8(2.275,-2.9) 9(2.275,2.9) 10(1.625,2.9) 11(0.975,2.9) 12(0.325,2.9) 13(-0.325,2.9) 14(-0.975,2.9) 15(-1.625,2.9) 16(-2.275,2.9)
Mechanical 2:
  circle w0.203: c-1.875,-1.3 r0.325
  lines w0.203: -2.45,-2.15 2.45,-2.15 2.45,2.15 -2.45,2.15 -2.45,-2.15
Mechanical 18:
  rectangle: -2.425,-3.3 -2.125,-2.23
  rectangle: -1.775,-3.3 -1.475,-2.23
  rectangle: -1.125,-3.3 -0.825,-2.23
  rectangle: -0.475,-3.3 -0.175,-2.23
  rectangle: 0.175,-3.3 0.475,-2.23
  rectangle: 0.825,-3.3 1.125,-2.23
  rectangle: 1.475,-3.3 1.775,-2.23
  rectangle: 2.125,-3.3 2.425,-2.23
  region: 2.425,3.3 2.125,3.3 2.125,2.23 2.425,2.23
  region: 1.775,3.3 1.475,3.3 1.475,2.23 1.775,2.23
  region: 1.125,3.3 0.825,3.3 0.825,2.23 1.125,2.23
  region: 0.475,3.3 0.175,3.3 0.175,2.23 0.475,2.23
  region: -0.175,3.3 -0.475,3.3 -0.475,2.23 -0.175,2.23
  region: -0.825,3.3 -1.125,3.3 -1.125,2.23 -0.825,2.23
  region: -1.475,3.3 -1.775,3.3 -1.775,2.23 -1.475,2.23
  region: -2.125,3.3 -2.425,3.3 -2.425,2.23 -2.125,2.23

## PW_R-PDSO-G20 [mm]
pads (20):
  rect 0.4x1.2 smd: 1(-2.925,-2.9) 2(-2.275,-2.9) 3(-1.625,-2.9) 4(-0.975,-2.9) 5(-0.325,-2.9) 6(0.325,-2.9) 7(0.975,-2.9) 8(1.625,-2.9) 9(2.275,-2.9) 10(2.925,-2.9) 11(2.925,2.9) 12(2.275,2.9) 13(1.625,2.9) 14(0.975,2.9) 15(0.325,2.9) 16(-0.325,2.9) 17(-0.975,2.9) 18(-1.625,2.9) 19(-2.275,2.9) 20(-2.925,2.9)
Mechanical 2:
  circle w0.203: c-2.525,-1.3 r0.325
  lines w0.203: -3.2,-2.15 3.2,-2.15 3.2,2.15 -3.2,2.15 -3.2,-2.15
Mechanical 18:
  rectangle: -3.075,-3.3 -2.775,-2.23
  rectangle: -2.425,-3.3 -2.125,-2.23
  rectangle: -1.775,-3.3 -1.475,-2.23
  rectangle: -1.125,-3.3 -0.825,-2.23
  rectangle: -0.475,-3.3 -0.175,-2.23
  rectangle: 0.175,-3.3 0.475,-2.23
  rectangle: 0.825,-3.3 1.125,-2.23
  rectangle: 1.475,-3.3 1.775,-2.23
  rectangle: 2.125,-3.3 2.425,-2.23
  rectangle: 2.775,-3.3 3.075,-2.23
  region: 3.075,3.3 2.775,3.3 2.775,2.23 3.075,2.23
  region: 2.425,3.3 2.125,3.3 2.125,2.23 2.425,2.23
  region: 1.775,3.3 1.475,3.3 1.475,2.23 1.775,2.23
  region: 1.125,3.3 0.825,3.3 0.825,2.23 1.125,2.23
  region: 0.475,3.3 0.175,3.3 0.175,2.23 0.475,2.23
  region: -0.175,3.3 -0.475,3.3 -0.475,2.23 -0.175,2.23
  region: -0.825,3.3 -1.125,3.3 -1.125,2.23 -0.825,2.23
  region: -1.475,3.3 -1.775,3.3 -1.775,2.23 -1.475,2.23
  region: -2.125,3.3 -2.425,3.3 -2.425,2.23 -2.125,2.23
  region: -2.775,3.3 -3.075,3.3 -3.075,2.23 -2.775,2.23

## PW_R-PDSO-G24 [mm]
pads (24):
  rect 0.4x1.2 smd: 1(-3.575,-2.9) 2(-2.925,-2.9) 3(-2.275,-2.9) 4(-1.625,-2.9) 5(-0.975,-2.9) 6(-0.325,-2.9) 7(0.325,-2.9) 8(0.975,-2.9) 9(1.625,-2.9) 10(2.275,-2.9) 11(2.925,-2.9) 12(3.575,-2.9) 13(3.575,2.9) 14(2.925,2.9) 15(2.275,2.9) 16(1.625,2.9) 17(0.975,2.9) 18(0.325,2.9) 19(-0.325,2.9) 20(-0.975,2.9) 21(-1.625,2.9) 22(-2.275,2.9) 23(-2.925,2.9) 24(-3.575,2.9)
Mechanical 2:
  circle w0.203: c-3.175,-1.3 r0.325
  lines w0.203: -3.85,-2.15 3.85,-2.15 3.85,2.15 -3.85,2.15 -3.85,-2.15
Mechanical 18:
  rectangle: -3.725,-3.3 -3.425,-2.23
  rectangle: -3.075,-3.3 -2.775,-2.23
  rectangle: -2.425,-3.3 -2.125,-2.23
  rectangle: -1.775,-3.3 -1.475,-2.23
  rectangle: -1.125,-3.3 -0.825,-2.23
  rectangle: -0.475,-3.3 -0.175,-2.23
  rectangle: 0.175,-3.3 0.475,-2.23
  rectangle: 0.825,-3.3 1.125,-2.23
  rectangle: 1.475,-3.3 1.775,-2.23
  rectangle: 2.125,-3.3 2.425,-2.23
  rectangle: 2.775,-3.3 3.075,-2.23
  rectangle: 3.425,-3.3 3.725,-2.23
  region: 3.725,3.3 3.425,3.3 3.425,2.23 3.725,2.23
  region: 3.075,3.3 2.775,3.3 2.775,2.23 3.075,2.23
  region: 2.425,3.3 2.125,3.3 2.125,2.23 2.425,2.23
  region: 1.775,3.3 1.475,3.3 1.475,2.23 1.775,2.23
  region: 1.125,3.3 0.825,3.3 0.825,2.23 1.125,2.23
  region: 0.475,3.3 0.175,3.3 0.175,2.23 0.475,2.23
  region: -0.175,3.3 -0.475,3.3 -0.475,2.23 -0.175,2.23
  region: -0.825,3.3 -1.125,3.3 -1.125,2.23 -0.825,2.23
  region: -1.475,3.3 -1.775,3.3 -1.775,2.23 -1.475,2.23
  region: -2.125,3.3 -2.425,3.3 -2.425,2.23 -2.125,2.23
  region: -2.775,3.3 -3.075,3.3 -3.075,2.23 -2.775,2.23
  region: -3.425,3.3 -3.725,3.3 -3.725,2.23 -3.425,2.23